# Altium footprint library Connector_Samtec_HLE_SMD.PcbLib: 290 footprints (part 12 of 24) (continued)
## Samtec_HLE-132-02-xxx-DV-A_2x32_P2.54mm_Horizontal [mm] (continued)
F.CrtYd:
  lines w0.05: -41.14,-4.17 -41.14,4.17 41.14,4.17 41.14,-4.17 -41.14,-4.17
F.Fab:
  lines w0.1: -39.87,2.54 -39.37,1.833 -38.87,2.54 ; -40.64,-2.54 -40.64,2.54 40.64,2.54 40.64,-2.54 -40.64,-2.54
  text "'.Designator'" at -4.047,-2.68 h1

## Samtec_HLE-132-02-xxx-DV-BE-A_2x32_P2.54mm_Horizontal [mm]
pads (130):
  rect 1.27x1.68 smd: 1(-39.37,2.72) 2(-39.37,-2.72) 3(-36.83,2.72) 4(-36.83,-2.72) 5(-34.29,2.72) 6(-34.29,-2.72) 7(-31.75,2.72) 8(-31.75,-2.72) 9(-29.21,2.72) 10(-29.21,-2.72) 11(-26.67,2.72) 12(-26.67,-2.72) 13(-24.13,2.72) 14(-24.13,-2.72) 15(-21.59,2.72) 16(-21.59,-2.72) 17(-19.05,2.72) 18(-19.05,-2.72) 19(-16.51,2.72) 20(-16.51,-2.72) 21(-13.97,2.72) 22(-13.97,-2.72) 23(-11.43,2.72) 24(-11.43,-2.72) 25(-8.89,2.72) 26(-8.89,-2.72) 27(-6.35,2.72) 28(-6.35,-2.72) 29(-3.81,2.72) 30(-3.81,-2.72) 31(-1.27,2.72) 32(-1.27,-2.72) 33(1.27,2.72) 34(1.27,-2.72) 35(3.81,2.72) 36(3.81,-2.72) 37(6.35,2.72) 38(6.35,-2.72) 39(8.89,2.72) 40(8.89,-2.72) 41(11.43,2.72) 42(11.43,-2.72) 43(13.97,2.72) 44(13.97,-2.72) 45(16.51,2.72) 46(16.51,-2.72) 47(19.05,2.72) 48(19.05,-2.72) 49(21.59,2.72) 50(21.59,-2.72) 51(24.13,2.72) 52(24.13,-2.72) 53(26.67,2.72) 54(26.67,-2.72) 55(29.21,2.72) 56(29.21,-2.72) 57(31.75,2.72) 58(31.75,-2.72) 59(34.29,2.72) 60(34.29,-2.72) 61(36.83,2.72) 62(36.83,-2.72) 63(39.37,2.72) 64(39.37,-2.72)
  round 1.78 hole 1.78: Un1(-38.1,0) Un59(38.1,0)
  round 0.97 hole 0.97: Un2(13.97,1.27) Un3(1.27,-1.27) Un4(36.83,-1.27) Un5(21.59,1.27) Un6(6.35,1.27) Un7(39.37,1.27) Un8(34.29,-1.27) Un9(16.51,1.27) Un10(-36.83,-1.27) Un11(3.81,1.27) Un12(-1.27,1.27) Un13(24.13,-1.27) Un14(-6.35,-1.27) Un15(-19.05,1.27) Un16(11.43,-1.27) Un17(26.67,-1.27) Un18(34.29,1.27) Un19(-26.67,1.27) Un20(19.05,1.27) Un21(26.67,1.27) Un22(31.75,-1.27) Un23(-24.13,1.27) Un24(3.81,-1.27) Un25(-31.75,-1.27) Un26(-39.37,-1.27) Un27(-3.81,-1.27) Un28(-1.27,-1.27) Un29(-24.13,-1.27) Un30(-11.43,1.27) Un31(1.27,1.27) Un32(-16.51,-1.27) Un33(-29.21,-1.27) Un34(13.97,-1.27) Un35(6.35,-1.27) Un36(-3.81,1.27) Un37(-8.89,1.27) Un38(24.13,1.27) Un39(8.89,-1.27) Un40(-19.05,-1.27) Un41(-21.59,-1.27) Un42(-34.29,-1.27) Un43(-16.51,1.27) Un44(21.59,-1.27) Un45(-8.89,-1.27) Un46(-11.43,-1.27) Un47(29.21,-1.27) Un48(11.43,1.27) Un49(-21.59,1.27) Un50(-34.29,1.27) Un51(-13.97,-1.27) Un52(-13.97,1.27) Un53(-6.35,1.27) Un54(29.21,1.27) Un55(-26.67,-1.27) Un56(31.75,1.27) Un57(8.89,1.27) Un58(39.37,-1.27) Un60(16.51,-1.27) Un61(-29.21,1.27) Un62(19.05,-1.27) Un63(-39.37,1.27) Un64(-36.83,1.27) Un65(36.83,1.27) Un66(-31.75,1.27)
F.SilkS:
  lines w0.12: -40.265,-2.65 -40.75,-2.65 -40.75,2.65 -40.265,2.65 -40.265,3.56 ; -38.475,-2.65 -37.725,-2.65 ; -38.475,2.65 -37.725,2.65 ; -35.935,-2.65 -35.185,-2.65 ; -35.935,2.65 -35.185,2.65 ; -33.395,-2.65 -32.645,-2.65 ; -33.395,2.65 -32.645,2.65 ; -30.855,-2.65 -30.105,-2.65 ; -30.855,2.65 -30.105,2.65 ; -28.315,-2.65 -27.565,-2.65 ; -28.315,2.65 -27.565,2.65 ; -25.775,-2.65 -25.025,-2.65 ; -25.775,2.65 -25.025,2.65 ; -23.235,-2.65 -22.485,-2.65 ; -23.235,2.65 -22.485,2.65 ; -20.695,-2.65 -19.945,-2.65 ; -20.695,2.65 -19.945,2.65 ; -18.155,-2.65 -17.405,-2.65 ; -18.155,2.65 -17.405,2.65 ; -15.615,-2.65 -14.865,-2.65 ; -15.615,2.65 -14.865,2.65 ; -13.075,-2.65 -12.325,-2.65 ; -13.075,2.65 -12.325,2.65 ; -10.535,-2.65 -9.785,-2.65 ; -10.535,2.65 -9.785,2.65 ; -7.995,-2.65 -7.245,-2.65 ; -7.995,2.65 -7.245,2.65 ; -5.455,-2.65 -4.705,-2.65 ; -5.455,2.65 -4.705,2.65 ; -2.915,-2.65 -2.165,-2.65 ; -2.915,2.65 -2.165,2.65 ; -0.375,-2.65 0.375,-2.65 ; -0.375,2.65 0.375,2.65 ; 2.165,-2.65 2.915,-2.65 ; 2.165,2.65 2.915,2.65 ; 4.705,-2.65 5.455,-2.65 ; 4.705,2.65 5.455,2.65 ; 7.245,-2.65 7.995,-2.65 ; 7.245,2.65 7.995,2.65 ; 9.785,-2.65 10.535,-2.65 ; 9.785,2.65 10.535,2.65 ; 12.325,-2.65 13.075,-2.65 ; 12.325,2.65 13.075,2.65 ; 14.865,-2.65 15.615,-2.65 ; 14.865,2.65 15.615,2.65 ; 17.405,-2.65 18.155,-2.65 ; 17.405,2.65 18.155,2.65 ; 19.945,-2.65 20.695,-2.65 ; 19.945,2.65 20.695,2.65 ; 22.485,-2.65 23.235,-2.65 ; 22.485,2.65 23.235,2.65 ; 25.025,-2.65 25.775,-2.65 ; 25.025,2.65 25.775,2.65 ; 27.565,-2.65 28.315,-2.65 ; 27.565,2.65 28.315,2.65 ; 30.105,-2.65 30.855,-2.65 ; 30.105,2.65 30.855,2.65 ; 32.645,-2.65 33.395,-2.65 ; 32.645,2.65 33.395,2.65 ; 35.185,-2.65 35.935,-2.65 ; 35.185,2.65 35.935,2.65 ; 37.725,-2.65 38.475,-2.65 ; 37.725,2.65 38.475,2.65 ; 40.265,-2.65 40.75,-2.65 40.75,2.65 40.265,2.65
F.CrtYd:
  lines w0.05: -41.14,-4.06 -41.14,4.06 41.14,4.06 41.14,-4.06 -41.14,-4.06
F.Fab:
  lines w0.1: -39.87,2.54 -39.37,1.833 -38.87,2.54 ; -40.64,-2.54 40.64,-2.54 40.64,2.54 -40.64,2.54 -40.64,-2.54
  text "'.Designator'" at -4.047,-2.68 h1

## Samtec_HLE-132-02-xxx-DV-BE-LC_2x32_P2.54mm_Horizontal [mm]
pads (130):
  rect 1.27x1.68 smd: 1(-39.37,2.72) 2(-39.37,-2.72) 3(-36.83,2.72) 4(-36.83,-2.72) 5(-34.29,2.72) 6(-34.29,-2.72) 7(-31.75,2.72) 8(-31.75,-2.72) 9(-29.21,2.72) 10(-29.21,-2.72) 11(-26.67,2.72) 12(-26.67,-2.72) 13(-24.13,2.72) 14(-24.13,-2.72) 15(-21.59,2.72) 16(-21.59,-2.72) 17(-19.05,2.72) 18(-19.05,-2.72) 19(-16.51,2.72) 20(-16.51,-2.72) 21(-13.97,2.72) 22(-13.97,-2.72) 23(-11.43,2.72) 24(-11.43,-2.72) 25(-8.89,2.72) 26(-8.89,-2.72) 27(-6.35,2.72) 28(-6.35,-2.72) 29(-3.81,2.72) 30(-3.81,-2.72) 31(-1.27,2.72) 32(-1.27,-2.72) 33(1.27,2.72) 34(1.27,-2.72) 35(3.81,2.72) 36(3.81,-2.72) 37(6.35,2.72) 38(6.35,-2.72) 39(8.89,2.72) 40(8.89,-2.72) 41(11.43,2.72) 42(11.43,-2.72) 43(13.97,2.72) 44(13.97,-2.72) 45(16.51,2.72) 46(16.51,-2.72) 47(19.05,2.72) 48(19.05,-2.72) 49(21.59,2.72) 50(21.59,-2.72) 51(24.13,2.72) 52(24.13,-2.72) 53(26.67,2.72) 54(26.67,-2.72) 55(29.21,2.72) 56(29.21,-2.72) 57(31.75,2.72) 58(31.75,-2.72) 59(34.29,2.72) 60(34.29,-2.72) 61(36.83,2.72) 62(36.83,-2.72) 63(39.37,2.72) 64(39.37,-2.72)
  round 0.97 hole 0.97: Un1(34.29,-1.27) Un2(-8.89,1.27) Un3(-16.51,-1.27) Un4(8.89,1.27) Un5(36.83,1.27) Un6(6.35,1.27) Un7(34.29,1.27) Un8(16.51,1.27) Un9(-21.59,-1.27) Un10(-24.13,-1.27) Un11(3.81,-1.27) Un12(-8.89,-1.27) Un13(-21.59,1.27) Un14(36.83,-1.27) Un15(13.97,1.27) Un16(-34.29,-1.27) Un17(1.27,1.27) Un18(-29.21,1.27) Un19(-29.21,-1.27) Un20(-11.43,1.27) Un21(-31.75,1.27) Un22(29.21,-1.27) Un23(-39.37,1.27) Un24(26.67,-1.27) Un25(39.37,1.27) Un26(31.75,1.27) Un27(-3.81,1.27) Un29(-26.67,-1.27) Un30(21.59,-1.27) Un31(1.27,-1.27) Un32(24.13,-1.27) Un33(-13.97,1.27) Un34(39.37,-1.27) Un35(-19.05,1.27) Un36(19.05,-1.27) Un37(-3.81,-1.27) Un38(-31.75,-1.27) Un39(-26.67,1.27) Un40(-6.35,1.27) Un41(-11.43,-1.27) Un42(-39.37,-1.27) Un43(26.67,1.27) Un44(16.51,-1.27) Un45(-36.83,-1.27) Un46(-6.35,-1.27) Un47(19.05,1.27) Un48(-1.27,-1.27) Un49(6.35,-1.27) Un50(-16.51,1.27) Un51(21.59,1.27) Un52(-34.29,1.27) Un53(13.97,-1.27) Un54(-36.83,1.27) Un55(11.43,-1.27) Un56(24.13,1.27) Un57(8.89,-1.27) Un59(31.75,-1.27) Un60(-19.05,-1.27) Un61(11.43,1.27) Un62(29.21,1.27) Un63(-1.27,1.27) Un64(3.81,1.27) Un65(-13.97,-1.27) Un66(-24.13,1.27)
  round 1.19 hole 1.19: Un28(38.1,0) Un58(-38.1,0)
F.SilkS:
  lines w0.12: -40.265,-2.65 -40.75,-2.65 -40.75,2.65 -40.265,2.65 -40.265,3.56 ; -38.475,-2.65 -37.725,-2.65 ; -38.475,2.65 -37.725,2.65 ; -35.935,-2.65 -35.185,-2.65 ; -35.935,2.65 -35.185,2.65 ; -33.395,-2.65 -32.645,-2.65 ; -33.395,2.65 -32.645,2.65 ; -30.855,-2.65 -30.105,-2.65 ; -30.855,2.65 -30.105,2.65 ; -28.315,-2.65 -27.565,-2.65 ; -28.315,2.65 -27.565,2.65 ; -25.775,-2.65 -25.025,-2.65 ; -25.775,2.65 -25.025,2.65 ; -23.235,-2.65 -22.485,-2.65 ; -23.235,2.65 -22.485,2.65 ; -20.695,-2.65 -19.945,-2.65 ; -20.695,2.65 -19.945,2.65 ; -18.155,-2.65 -17.405,-2.65 ; -18.155,2.65 -17.405,2.65 ; -15.615,-2.65 -14.865,-2.65 ; -15.615,2.65 -14.865,2.65 ; -13.075,-2.65 -12.325,-2.65 ; -13.075,2.65 -12.325,2.65 ; -10.535,-2.65 -9.785,-2.65 ; -10.535,2.65 -9.785,2.65 ; -7.995,-2.65 -7.245,-2.65 ; -7.995,2.65 -7.245,2.65 ; -5.455,-2.65 -4.705,-2.65 ; -5.455,2.65 -4.705,2.65 ; -2.915,-2.65 -2.165,-2.65 ; -2.915,2.65 -2.165,2.65 ; -0.375,-2.65 0.375,-2.65 ; -0.375,2.65 0.375,2.65 ; 2.165,-2.65 2.915,-2.65 ; 2.165,2.65 2.915,2.65 ; 4.705,-2.65 5.455,-2.65 ; 4.705,2.65 5.455,2.65 ; 7.245,-2.65 7.995,-2.65 ; 7.245,2.65 7.995,2.65 ; 9.785,-2.65 10.535,-2.65 ; 9.785,2.65 10.535,2.65 ; 12.325,-2.65 13.075,-2.65 ; 12.325,2.65 13.075,2.65 ; 14.865,-2.65 15.615,-2.65 ; 14.865,2.65 15.615,2.65 ; 17.405,-2.65 18.155,-2.65 ; 17.405,2.65 18.155,2.65 ; 19.945,-2.65 20.695,-2.65 ; 19.945,2.65 20.695,2.65 ; 22.485,-2.65 23.235,-2.65 ; 22.485,2.65 23.235,2.65 ; 25.025,-2.65 25.775,-2.65 ; 25.025,2.65 25.775,2.65 ; 27.565,-2.65 28.315,-2.65 ; 27.565,2.65 28.315,2.65 ; 30.105,-2.65 30.855,-2.65 ; 30.105,2.65 30.855,2.65 ; 32.645,-2.65 33.395,-2.65 ; 32.645,2.65 33.395,2.65 ; 35.185,-2.65 35.935,-2.65 ; 35.185,2.65 35.935,2.65 ; 37.725,-2.65 38.475,-2.65 ; 37.725,2.65 38.475,2.65 ; 40.265,-2.65 40.75,-2.65 40.75,2.65 40.265,2.65
F.CrtYd:
  lines w0.05: -41.14,-4.06 41.14,-4.06 41.14,4.06 -41.14,4.06 -41.14,-4.06
F.Fab:
  lines w0.1: -39.87,2.54 -39.37,1.833 -38.87,2.54 ; -40.64,-2.54 -40.64,2.54 40.64,2.54 40.64,-2.54 -40.64,-2.54
  text "'.Designator'" at -4.047,-2.68 h1

## Samtec_HLE-132-02-xxx-DV-BE_2x32_P2.54mm_Horizontal [mm]
pads (128):
  rect 1.27x1.68 smd: 1(-39.37,2.72) 2(-39.37,-2.72) 3(-36.83,2.72) 4(-36.83,-2.72) 5(-34.29,2.72) 6(-34.29,-2.72) 7(-31.75,2.72) 8(-31.75,-2.72) 9(-29.21,2.72) 10(-29.21,-2.72) 11(-26.67,2.72) 12(-26.67,-2.72) 13(-24.13,2.72) 14(-24.13,-2.72) 15(-21.59,2.72) 16(-21.59,-2.72) 17(-19.05,2.72) 18(-19.05,-2.72) 19(-16.51,2.72) 20(-16.51,-2.72) 21(-13.97,2.72) 22(-13.97,-2.72) 23(-11.43,2.72) 24(-11.43,-2.72) 25(-8.89,2.72) 26(-8.89,-2.72) 27(-6.35,2.72) 28(-6.35,-2.72) 29(-3.81,2.72) 30(-3.81,-2.72) 31(-1.27,2.72) 32(-1.27,-2.72) 33(1.27,2.72) 34(1.27,-2.72) 35(3.81,2.72) 36(3.81,-2.72) 37(6.35,2.72) 38(6.35,-2.72) 39(8.89,2.72) 40(8.89,-2.72) 41(11.43,2.72) 42(11.43,-2.72) 43(13.97,2.72) 44(13.97,-2.72) 45(16.51,2.72) 46(16.51,-2.72) 47(19.05,2.72) 48(19.05,-2.72) 49(21.59,2.72) 50(21.59,-2.72) 51(24.13,2.72) 52(24.13,-2.72) 53(26.67,2.72) 54(26.67,-2.72) 55(29.21,2.72) 56(29.21,-2.72) 57(31.75,2.72) 58(31.75,-2.72) 59(34.29,2.72) 60(34.29,-2.72) 61(36.83,2.72) 62(36.83,-2.72) 63(39.37,2.72) 64(39.37,-2.72)
  round 0.97 hole 0.97: Un1(21.59,1.27) Un2(16.51,1.27) Un3(36.83,1.27) Un4(-13.97,-1.27) Un5(13.97,1.27) Un6(-29.21,-1.27) Un7(-19.05,1.27) Un8(6.35,-1.27) Un9(-39.37,-1.27) Un10(8.89,-1.27) Un11(-34.29,-1.27) Un12(-36.83,-1.27) Un13(19.05,1.27) Un14(34.29,1.27) Un15(39.37,1.27) Un16(3.81,1.27) Un17(-11.43,-1.27) Un18(-34.29,1.27) Un19(-24.13,-1.27) Un20(-6.35,-1.27) Un21(-11.43,1.27) Un22(-26.67,-1.27) Un23(-8.89,1.27) Un24(-6.35,1.27) Un25(-29.21,1.27) Un26(1.27,-1.27) Un27(16.51,-1.27) Un28(29.21,-1.27) Un29(-19.05,-1.27) Un30(3.81,-1.27) Un31(-16.51,-1.27) Un32(-21.59,1.27) Un33(1.27,1.27) Un34(11.43,1.27) Un35(-1.27,1.27) Un36(29.21,1.27) Un37(31.75,1.27) Un38(24.13,1.27) Un39(-31.75,1.27) Un40(34.29,-1.27) Un41(6.35,1.27) Un42(-13.97,1.27) Un43(13.97,-1.27) Un44(31.75,-1.27) Un45(-31.75,-1.27) Un46(-1.27,-1.27) Un47(8.89,1.27) Un48(-3.81,-1.27) Un49(39.37,-1.27) Un50(36.83,-1.27) Un51(26.67,-1.27) Un52(-39.37,1.27) Un53(-21.59,-1.27) Un54(-16.51,1.27) Un55(24.13,-1.27) Un56(-26.67,1.27) Un57(-8.89,-1.27) Un58(19.05,-1.27) Un59(26.67,1.27) Un60(21.59,-1.27) Un61(-3.81,1.27) Un62(11.43,-1.27) Un63(-24.13,1.27) Un64(-36.83,1.27)
F.SilkS:
  lines w0.12: -40.265,-2.65 -40.75,-2.65 -40.75,2.65 -40.265,2.65 -40.265,3.56 ; -38.475,-2.65 -37.725,-2.65 ; -38.475,2.65 -37.725,2.65 ; -35.935,-2.65 -35.185,-2.65 ; -35.935,2.65 -35.185,2.65 ; -33.395,-2.65 -32.645,-2.65 ; -33.395,2.65 -32.645,2.65 ; -30.855,-2.65 -30.105,-2.65 ; -30.855,2.65 -30.105,2.65 ; -28.315,-2.65 -27.565,-2.65 ; -28.315,2.65 -27.565,2.65 ; -25.775,-2.65 -25.025,-2.65 ; -25.775,2.65 -25.025,2.65 ; -23.235,-2.65 -22.485,-2.65 ; -23.235,2.65 -22.485,2.65 ; -20.695,-2.65 -19.945,-2.65 ; -20.695,2.65 -19.945,2.65 ; -18.155,-2.65 -17.405,-2.65 ; -18.155,2.65 -17.405,2.65 ; -15.615,-2.65 -14.865,-2.65 ; -15.615,2.65 -14.865,2.65 ; -13.075,-2.65 -12.325,-2.65 ; -13.075,2.65 -12.325,2.65 ; -10.535,-2.65 -9.785,-2.65 ; -10.535,2.65 -9.785,2.65 ; -7.995,-2.65 -7.245,-2.65 ; -7.995,2.65 -7.245,2.65 ; -5.455,-2.65 -4.705,-2.65 ; -5.455,2.65 -4.705,2.65 ; -2.915,-2.65 -2.165,-2.65 ; -2.915,2.65 -2.165,2.65 ; -0.375,-2.65 0.375,-2.65 ; -0.375,2.65 0.375,2.65 ; 2.165,-2.65 2.915,-2.65 ; 2.165,2.65 2.915,2.65 ; 4.705,-2.65 5.455,-2.65 ; 4.705,2.65 5.455,2.65 ; 7.245,-2.65 7.995,-2.65 ; 7.245,2.65 7.995,2.65 ; 9.785,-2.65 10.535,-2.65 ; 9.785,2.65 10.535,2.65 ; 12.325,-2.65 13.075,-2.65 ; 12.325,2.65 13.075,2.65 ; 14.865,-2.65 15.615,-2.65 ; 14.865,2.65 15.615,2.65 ; 17.405,-2.65 18.155,-2.65 ; 17.405,2.65 18.155,2.65 ; 19.945,-2.65 20.695,-2.65 ; 19.945,2.65 20.695,2.65 ; 22.485,-2.65 23.235,-2.65 ; 22.485,2.65 23.235,2.65 ; 25.025,-2.65 25.775,-2.65 ; 25.025,2.65 25.775,2.65 ; 27.565,-2.65 28.315,-2.65 ; 27.565,2.65 28.315,2.65 ; 30.105,-2.65 30.855,-2.65 ; 30.105,2.65 30.855,2.65 ; 32.645,-2.65 33.395,-2.65 ; 32.645,2.65 33.395,2.65 ; 35.185,-2.65 35.935,-2.65 ; 35.185,2.65 35.935,2.65 ; 37.725,-2.65 38.475,-2.65 ; 37.725,2.65 38.475,2.65 ; 40.265,-2.65 40.75,-2.65 40.75,2.65 40.265,2.65
F.CrtYd:
  lines w0.05: -41.14,-4.06 -41.14,4.06 41.14,4.06 41.14,-4.06 -41.14,-4.06
F.Fab:
  lines w0.1: -39.87,2.54 -39.37,1.833 -38.87,2.54 ; -40.64,-2.54 40.64,-2.54 40.64,2.54 -40.64,2.54 -40.64,-2.54
  text "'.Designator'" at -4.047,-2.68 h1

## Samtec_HLE-132-02-xxx-DV-LC_2x32_P2.54mm_Horizontal [mm]
pads (66):
  rect 1.27x2.29 smd: 1(-39.37,2.525) 2(-39.37,-2.525) 3(-36.83,2.525) 4(-36.83,-2.525) 5(-34.29,2.525) 6(-34.29,-2.525) 7(-31.75,2.525) 8(-31.75,-2.525) 9(-29.21,2.525) 10(-29.21,-2.525) 11(-26.67,2.525) 12(-26.67,-2.525) 13(-24.13,2.525) 14(-24.13,-2.525) 15(-21.59,2.525) 16(-21.59,-2.525) 17(-19.05,2.525) 18(-19.05,-2.525) 19(-16.51,2.525) 20(-16.51,-2.525) 21(-13.97,2.525) 22(-13.97,-2.525) 23(-11.43,2.525) 24(-11.43,-2.525) 25(-8.89,2.525) 26(-8.89,-2.525) 27(-6.35,2.525) 28(-6.35,-2.525) 29(-3.81,2.525) 30(-3.81,-2.525) 31(-1.27,2.525) 32(-1.27,-2.525) 33(1.27,2.525) 34(1.27,-2.525) 35(3.81,2.525) 36(3.81,-2.525) 37(6.35,2.525) 38(6.35,-2.525) 39(8.89,2.525) 40(8.89,-2.525) 41(11.43,2.525) 42(11.43,-2.525) 43(13.97,2.525) 44(13.97,-2.525) 45(16.51,2.525) 46(16.51,-2.525) 47(19.05,2.525) 48(19.05,-2.525) 49(21.59,2.525) 50(21.59,-2.525) 51(24.13,2.525) 52(24.13,-2.525) 53(26.67,2.525) 54(26.67,-2.525) 55(29.21,2.525) 56(29.21,-2.525) 57(31.75,2.525) 58(31.75,-2.525) 59(34.29,2.525) 60(34.29,-2.525) 61(36.83,2.525) 62(36.83,-2.525) 63(39.37,2.525) 64(39.37,-2.525)
  round 1.19 hole 1.19: Un1(38.1,0) Un2(-38.1,0)
F.SilkS:
  lines w0.12: -40.265,-2.65 -40.75,-2.65 -40.75,2.65 -40.265,2.65 -40.265,3.67 ; -38.475,-2.65 -37.725,-2.65 ; -38.475,2.65 -37.725,2.65 ; -35.935,-2.65 -35.185,-2.65 ; -35.935,2.65 -35.185,2.65 ; -33.395,-2.65 -32.645,-2.65 ; -33.395,2.65 -32.645,2.65 ; -30.855,-2.65 -30.105,-2.65 ; -30.855,2.65 -30.105,2.65 ; -28.315,-2.65 -27.565,-2.65 ; -28.315,2.65 -27.565,2.65 ; -25.775,-2.65 -25.025,-2.65 ; -25.775,2.65 -25.025,2.65 ; -23.235,-2.65 -22.485,-2.65 ; -23.235,2.65 -22.485,2.65 ; -20.695,-2.65 -19.945,-2.65 ; -20.695,2.65 -19.945,2.65 ; -18.155,-2.65 -17.405,-2.65 ; -18.155,2.65 -17.405,2.65 ; -15.615,-2.65 -14.865,-2.65 ; -15.615,2.65 -14.865,2.65 ; -13.075,-2.65 -12.325,-2.65 ; -13.075,2.65 -12.325,2.65 ; -10.535,-2.65 -9.785,-2.65 ; -10.535,2.65 -9.785,2.65 ; -7.995,-2.65 -7.245,-2.65 ; -7.995,2.65 -7.245,2.65 ; -5.455,-2.65 -4.705,-2.65 ; -5.455,2.65 -4.705,2.65 ; -2.915,-2.65 -2.165,-2.65 ; -2.915,2.65 -2.165,2.65 ; -0.375,-2.65 0.375,-2.65 ; -0.375,2.65 0.375,2.65 ; 2.165,-2.65 2.915,-2.65 ; 2.165,2.65 2.915,2.65 ; 4.705,-2.65 5.455,-2.65 ; 4.705,2.65 5.455,2.65 ; 7.245,-2.65 7.995,-2.65 ; 7.245,2.65 7.995,2.65 ; 9.785,-2.65 10.535,-2.65 ; 9.785,2.65 10.535,2.65 ; 12.325,-2.65 13.075,-2.65 ; 12.325,2.65 13.075,2.65 ; 14.865,-2.65 15.615,-2.65 ; 14.865,2.65 15.615,2.65 ; 17.405,-2.65 18.155,-2.65 ; 17.405,2.65 18.155,2.65 ; 19.945,-2.65 20.695,-2.65 ; 19.945,2.65 20.695,2.65 ; 22.485,-2.65 23.235,-2.65 ; 22.485,2.65 23.235,2.65 ; 25.025,-2.65 25.775,-2.65 ; 25.025,2.65 25.775,2.65 ; 27.565,-2.65 28.315,-2.65 ; 27.565,2.65 28.315,2.65 ; 30.105,-2.65 30.855,-2.65 ; 30.105,2.65 30.855,2.65 ; 32.645,-2.65 33.395,-2.65 ; 32.645,2.65 33.395,2.65 ; 35.185,-2.65 35.935,-2.65 ; 35.185,2.65 35.935,2.65 ; 37.725,-2.65 38.475,-2.65 ; 37.725,2.65 38.475,2.65 ; 40.265,-2.65 40.75,-2.65 40.75,2.65 40.265,2.65
F.CrtYd:
  lines w0.05: -41.14,-4.17 -41.14,4.17 41.14,4.17 41.14,-4.17 -41.14,-4.17
F.Fab:
  lines w0.1: -39.87,2.54 -39.37,1.833 -38.87,2.54 ; -40.64,-2.54 40.64,-2.54 40.64,2.54 -40.64,2.54 -40.64,-2.54
  text "'.Designator'" at -4.047,-2.68 h1

## Samtec_HLE-132-02-xxx-DV_2x32_P2.54mm_Horizontal [mm]
pads (64):
  rect 1.27x2.29 smd: 1(-39.37,2.525) 2(-39.37,-2.525) 3(-36.83,2.525) 4(-36.83,-2.525) 5(-34.29,2.525) 6(-34.29,-2.525) 7(-31.75,2.525) 8(-31.75,-2.525) 9(-29.21,2.525) 10(-29.21,-2.525) 11(-26.67,2.525) 12(-26.67,-2.525) 13(-24.13,2.525) 14(-24.13,-2.525) 15(-21.59,2.525) 16(-21.59,-2.525) 17(-19.05,2.525) 18(-19.05,-2.525) 19(-16.51,2.525) 20(-16.51,-2.525) 21(-13.97,2.525) 22(-13.97,-2.525) 23(-11.43,2.525) 24(-11.43,-2.525) 25(-8.89,2.525) 26(-8.89,-2.525) 27(-6.35,2.525) 28(-6.35,-2.525) 29(-3.81,2.525) 30(-3.81,-2.525) 31(-1.27,2.525) 32(-1.27,-2.525) 33(1.27,2.525) 34(1.27,-2.525) 35(3.81,2.525) 36(3.81,-2.525) 37(6.35,2.525) 38(6.35,-2.525) 39(8.89,2.525) 40(8.89,-2.525) 41(11.43,2.525) 42(11.43,-2.525) 43(13.97,2.525) 44(13.97,-2.525) 45(16.51,2.525) 46(16.51,-2.525) 47(19.05,2.525) 48(19.05,-2.525) 49(21.59,2.525) 50(21.59,-2.525) 51(24.13,2.525) 52(24.13,-2.525) 53(26.67,2.525) 54(26.67,-2.525) 55(29.21,2.525) 56(29.21,-2.525) 57(31.75,2.525) 58(31.75,-2.525) 59(34.29,2.525) 60(34.29,-2.525) 61(36.83,2.525) 62(36.83,-2.525) 63(39.37,2.525) 64(39.37,-2.525)
F.SilkS:
  lines w0.12: -40.265,-2.65 -40.75,-2.65 -40.75,2.65 -40.265,2.65 -40.265,3.67 ; -38.475,-2.65 -37.725,-2.65 ; -38.475,2.65 -37.725,2.65 ; -35.935,-2.65 -35.185,-2.65 ; -35.935,2.65 -35.185,2.65 ; -33.395,-2.65 -32.645,-2.65 ; -33.395,2.65 -32.645,2.65 ; -30.855,-2.65 -30.105,-2.65 ; -30.855,2.65 -30.105,2.65 ; -28.315,-2.65 -27.565,-2.65 ; -28.315,2.65 -27.565,2.65 ; -25.775,-2.65 -25.025,-2.65 ; -25.775,2.65 -25.025,2.65 ; -23.235,-2.65 -22.485,-2.65 ; -23.235,2.65 -22.485,2.65 ; -20.695,-2.65 -19.945,-2.65 ; -20.695,2.65 -19.945,2.65 ; -18.155,-2.65 -17.405,-2.65 ; -18.155,2.65 -17.405,2.65 ; -15.615,-2.65 -14.865,-2.65 ; -15.615,2.65 -14.865,2.65 ; -13.075,-2.65 -12.325,-2.65 ; -13.075,2.65 -12.325,2.65 ; -10.535,-2.65 -9.785,-2.65 ; -10.535,2.65 -9.785,2.65 ; -7.995,-2.65 -7.245,-2.65 ; -7.995,2.65 -7.245,2.65 ; -5.455,-2.65 -4.705,-2.65 ; -5.455,2.65 -4.705,2.65 ; -2.915,-2.65 -2.165,-2.65 ; -2.915,2.65 -2.165,2.65 ; -0.375,-2.65 0.375,-2.65 ; -0.375,2.65 0.375,2.65 ; 2.165,-2.65 2.915,-2.65 ; 2.165,2.65 2.915,2.65 ; 4.705,-2.65 5.455,-2.65 ; 4.705,2.65 5.455,2.65 ; 7.245,-2.65 7.995,-2.65 ; 7.245,2.65 7.995,2.65 ; 9.785,-2.65 10.535,-2.65 ; 9.785,2.65 10.535,2.65 ; 12.325,-2.65 13.075,-2.65 ; 12.325,2.65 13.075,2.65 ; 14.865,-2.65 15.615,-2.65 ; 14.865,2.65 15.615,2.65 ; 17.405,-2.65 18.155,-2.65 ; 17.405,2.65 18.155,2.65 ; 19.945,-2.65 20.695,-2.65 ; 19.945,2.65 20.695,2.65 ; 22.485,-2.65 23.235,-2.65 ; 22.485,2.65 23.235,2.65 ; 25.025,-2.65 25.775,-2.65 ; 25.025,2.65 25.775,2.65 ; 27.565,-2.65 28.315,-2.65 ; 27.565,2.65 28.315,2.65 ; 30.105,-2.65 30.855,-2.65 ; 30.105,2.65 30.855,2.65 ; 32.645,-2.65 33.395,-2.65 ; 32.645,2.65 33.395,2.65 ; 35.185,-2.65 35.935,-2.65 ; 35.185,2.65 35.935,2.65 ; 37.725,-2.65 38.475,-2.65 ; 37.725,2.65 38.475,2.65 ; 40.265,-2.65 40.75,-2.65 40.75,2.65 40.265,2.65
F.CrtYd:
  lines w0.05: -41.14,-4.17 41.14,-4.17 41.14,4.17 -41.14,4.17 -41.14,-4.17
F.Fab:
  lines w0.1: -39.87,2.54 -39.37,1.833 -38.87,2.54 ; -40.64,-2.54 -40.64,2.54 40.64,2.54 40.64,-2.54 -40.64,-2.54
  text "'.Designator'" at -4.047,-2.68 h1

## Samtec_HLE-133-02-xxx-DV-A_2x33_P2.54mm_Horizontal [mm]
pads (68):
  rect 1.27x2.29 smd: 1(-40.64,2.525) 2(-40.64,-2.525) 3(-38.1,2.525) 4(-38.1,-2.525) 5(-35.56,2.525) 6(-35.56,-2.525) 7(-33.02,2.525) 8(-33.02,-2.525) 9(-30.48,2.525) 10(-30.48,-2.525) 11(-27.94,2.525) 12(-27.94,-2.525) 13(-25.4,2.525) 14(-25.4,-2.525) 15(-22.86,2.525) 16(-22.86,-2.525) 17(-20.32,2.525) 18(-20.32,-2.525) 19(-17.78,2.525) 20(-17.78,-2.525) 21(-15.24,2.525) 22(-15.24,-2.525) 23(-12.7,2.525) 24(-12.7,-2.525) 25(-10.16,2.525) 26(-10.16,-2.525) 27(-7.62,2.525) 28(-7.62,-2.525) 29(-5.08,2.525) 30(-5.08,-2.525) 31(-2.54,2.525) 32(-2.54,-2.525) 33(0,2.525) 34(0,-2.525) 35(2.54,2.525) 36(2.54,-2.525) 37(5.08,2.525) 38(5.08,-2.525) 39(7.62,2.525) 40(7.62,-2.525) 41(10.16,2.525) 42(10.16,-2.525) 43(12.7,2.525) 44(12.7,-2.525) 45(15.24,2.525) 46(15.24,-2.525) 47(17.78,2.525) 48(17.78,-2.525) 49(20.32,2.525) 50(20.32,-2.525) 51(22.86,2.525) 52(22.86,-2.525) 53(25.4,2.525) 54(25.4,-2.525) 55(27.94,2.525) 56(27.94,-2.525) 57(30.48,2.525) 58(30.48,-2.525) 59(33.02,2.525) 60(33.02,-2.525) 61(35.56,2.525) 62(35.56,-2.525) 63(38.1,2.525) 64(38.1,-2.525) 65(40.64,2.525) 66(40.64,-2.525)
  round 1.78 hole 1.78: Un1(-39.37,0) Un2(39.37,0)
F.SilkS:
  lines w0.12: -41.535,-2.65 -42.02,-2.65 -42.02,2.65 -41.535,2.65 -41.535,3.67 ; -39.745,-2.65 -38.995,-2.65 ; -39.745,2.65 -38.995,2.65 ; -37.205,-2.65 -36.455,-2.65 ; -37.205,2.65 -36.455,2.65 ; -34.665,-2.65 -33.915,-2.65 ; -34.665,2.65 -33.915,2.65 ; -32.125,-2.65 -31.375,-2.65 ; -32.125,2.65 -31.375,2.65 ; -29.585,-2.65 -28.835,-2.65 ; -29.585,2.65 -28.835,2.65 ; -27.045,-2.65 -26.295,-2.65 ; -27.045,2.65 -26.295,2.65 ; -24.505,-2.65 -23.755,-2.65 ; -24.505,2.65 -23.755,2.65 ; -21.965,-2.65 -21.215,-2.65 ; -21.965,2.65 -21.215,2.65 ; -19.425,-2.65 -18.675,-2.65 ; -19.425,2.65 -18.675,2.65 ; -16.885,-2.65 -16.135,-2.65 ; -16.885,2.65 -16.135,2.65 ; -14.345,-2.65 -13.595,-2.65 ; -14.345,2.65 -13.595,2.65 ; -11.805,-2.65 -11.055,-2.65 ; -11.805,2.65 -11.055,2.65 ; -9.265,-2.65 -8.515,-2.65 ; -9.265,2.65 -8.515,2.65 ; -6.725,-2.65 -5.975,-2.65 ; -6.725,2.65 -5.975,2.65 ; -4.185,-2.65 -3.435,-2.65 ; -4.185,2.65 -3.435,2.65 ; -1.645,-2.65 -0.895,-2.65 ; -1.645,2.65 -0.895,2.65 ; 0.895,-2.65 1.645,-2.65 ; 0.895,2.65 1.645,2.65 ; 3.435,-2.65 4.185,-2.65 ; 3.435,2.65 4.185,2.65 ; 5.975,-2.65 6.725,-2.65 ; 5.975,2.65 6.725,2.65 ; 8.515,-2.65 9.265,-2.65 ; 8.515,2.65 9.265,2.65 ; 11.055,-2.65 11.805,-2.65 ; 11.055,2.65 11.805,2.65 ; 13.595,-2.65 14.345,-2.65 ; 13.595,2.65 14.345,2.65 ; 16.135,-2.65 16.885,-2.65 ; 16.135,2.65 16.885,2.65 ; 18.675,-2.65 19.425,-2.65 ; 18.675,2.65 19.425,2.65 ; 21.215,-2.65 21.965,-2.65 ; 21.215,2.65 21.965,2.65 ; 23.755,-2.65 24.505,-2.65 ; 23.755,2.65 24.505,2.65 ; 26.295,-2.65 27.045,-2.65 ; 26.295,2.65 27.045,2.65 ; 28.835,-2.65 29.585,-2.65 ; 28.835,2.65 29.585,2.65 ; 31.375,-2.65 32.125,-2.65 ; 31.375,2.65 32.125,2.65 ; 33.915,-2.65 34.665,-2.65 ; 33.915,2.65 34.665,2.65 ; 36.455,-2.65 37.205,-2.65 ; 36.455,2.65 37.205,2.65 ; 38.995,-2.65 39.745,-2.65 ; 38.995,2.65 39.745,2.65 ; 41.535,-2.65 42.02,-2.65 42.02,2.65 41.535,2.65
F.CrtYd:
  lines w0.05: -42.41,-4.17 -42.41,4.17 42.41,4.17 42.41,-4.17 -42.41,-4.17
F.Fab:
  lines w0.1: -41.14,2.54 -40.64,1.833 -40.14,2.54 ; -41.91,-2.54 41.91,-2.54 41.91,2.54 -41.91,2.54 -41.91,-2.54
  text "'.Designator'" at -4.047,-2.68 h1